# Altium footprint library ALL.PcbLib: 385 footprints (part 11 of 25) (continued)
## hdr-2x5-2.54mm-box [mil]
pads (10):
  oval 70x85 hole 48: 1(0,0) 2(0,100) 3(100,0) 4(100,100) 5(200,0) 6(200,100) 7(300,0) 8(300,100) 9(400,0) 10(400,100)
Top Overlay:
  lines w8: -200,0 -175,0 ; -200,100 -175,100 ; -191.67,0 -191.67,100 ; -25,-100 0,-50 25,-100 ; 125,-125 125,-100 ; 275,-125 275,-100 ; 575,0 600,0 ; 575,100 600,100 ; 591.67,0 591.67,100 ; 125,-100 275,-100 ; 125,-100 -175,-100 -175,200 575,200 575,-100 275,-100 ; -200,-125 -200,225 600,225 600,-125 -200,-125
  text "1" at -83,-25 h45
  text "2" at -89,83 h45
Mechanical 13:
  lines w3.94: 125,-125 125,-100 ; 275,-125 275,-100 ; 125,-100 -175,-100 -175,200 575,200 575,-100 275,-100 ; 125,-100 275,-100 ; 287.5,-12.5 287.5,0 ; 287.5,-12.5 300,-12.5 ; 287.5,-12.5 287.5,0 ; 287.5,-12.5 300,-12.5 ; 287.5,0 287.5,12.5 ; 287.5,0 287.5,12.5 ; 287.5,12.5 300,12.5 ; 287.5,12.5 300,12.5 ; 300,-12.5 312.5,-12.5 ; 300,-12.5 312.5,-12.5 ; 300,12.5 312.5,12.5 ; 300,12.5 312.5,12.5 ; 312.5,-12.5 312.5,0 ; 312.5,-12.5 312.5,0 ; 312.5,0 312.5,12.5 ; 312.5,0 312.5,12.5 ; -200,-125 600,-125 600,225 -200,225 -200,-125 ; -12.5,-12.5 0,-12.5 12.5,-12.5 12.5,0 12.5,12.5 0,12.5 -12.5,12.5 -12.5,0 -12.5,-12.5 ; -12.5,87.5 -12.5,100 -12.5,112.5 0,112.5 12.5,112.5 12.5,100 12.5,87.5 0,87.5 -12.5,87.5 ; 87.5,-12.5 87.5,0 87.5,12.5 100,12.5 112.5,12.5 112.5,0 112.5,-12.5 100,-12.5 87.5,-12.5 ; 87.5,87.5 87.5,100 87.5,112.5 100,112.5 112.5,112.5 112.5,100 112.5,87.5 100,87.5 87.5,87.5 ; 187.5,-12.5 187.5,0 187.5,12.5 200,12.5 212.5,12.5 212.5,0 212.5,-12.5 200,-12.5 187.5,-12.5 ; 187.5,87.5 187.5,100 187.5,112.5 200,112.5 212.5,112.5 212.5,100 212.5,87.5 200,87.5 187.5,87.5 ; 287.5,87.5 287.5,100 287.5,112.5 300,112.5 312.5,112.5 312.5,100 312.5,87.5 300,87.5 287.5,87.5 ; 387.5,-12.5 387.5,0 387.5,12.5 400,12.5 412.5,12.5 412.5,0 412.5,-12.5 400,-12.5 387.5,-12.5 ; 387.5,87.5 387.5,100 387.5,112.5 400,112.5 412.5,112.5 412.5,100 412.5,87.5 400,87.5 387.5,87.5
Mechanical 15:
  lines w3.94: 175,50 200,50 ; 200,25 200,50 ; 200,75 200,50 ; 225,50 200,50 ; -210,-135 -210,235 610,235 610,-135 -210,-135
3D body: height 346.46, standoff 0, extent -199.98,-124.98 599.98,224.98
3D body: height 78.74, standoff 0, extent -174.98,-99.98 574.98,199.98
3D body: height 118.11, standoff 0, extent 125.02,-124.98 274.98,-100.02
3D body: height 314.96, standoff -129.92, extent -12.48,-12.48 12.48,12.48
3D body: height 314.96, standoff -129.92, extent 87.52,-12.48 112.48,12.48
3D body: height 314.96, standoff -129.92, extent 187.52,-12.48 212.48,12.48
3D body: height 314.96, standoff -129.92, extent 287.52,-12.48 312.48,12.48
3D body: height 314.96, standoff -129.92, extent 387.52,-12.48 412.48,12.48
3D body: height 314.96, standoff -129.92, extent 387.52,87.52 412.48,112.48
3D body: height 314.96, standoff -129.92, extent 287.52,87.52 312.48,112.48
3D body: height 314.96, standoff -129.92, extent 187.52,87.52 212.48,112.48
3D body: height 314.96, standoff -129.92, extent 87.52,87.52 112.48,112.48
3D body: height 314.96, standoff -129.92, extent -12.48,87.52 12.48,112.48

## hdr-2x6-2.54-f [mm]
pads (12):
  round 1.8 hole 1: 1(0,0) 2(0,-2.54) 3(2.54,0) 4(2.54,-2.54) 5(5.08,0) 6(5.08,-2.54) 7(7.62,0) 8(7.62,-2.54) 9(10.16,0) 10(10.16,-2.54) 11(12.7,0) 12(12.7,-2.54)
Top Overlay:
  circle w0.2: c-1.73,0.03 r0.2
  lines w0.2: -1.27,-3.81 13.97,-3.81 13.97,1.27 -1.27,1.27 -1.27,-3.81
3D body "PBD-2.stp": height 8.5, standoff -3.15, extent 1.27,-3.81 3.81,1.27
3D body "PBD-2.stp": height 8.5, standoff -3.15, extent -1.27,-3.81 1.27,1.27
3D body "PBD-2.stp": height 8.5, standoff -3.15, extent 6.35,-3.81 8.89,1.27
3D body "PBD-2.stp": height 8.5, standoff -3.15, extent 3.81,-3.81 6.35,1.27
3D body "PBD-2.stp": height 8.5, standoff -3.15, extent 11.43,-3.81 13.97,1.27
3D body "PBD-2.stp": height 8.5, standoff -3.15, extent 8.89,-3.81 11.43,1.27

## hdr-2x6-2.54-r [mm]
pads (12):
  round 1.62 hole 1.02: 1(0,0) 2(0,2.54) 3(2.54,0) 4(2.54,2.54) 5(5.08,0) 6(5.08,2.54) 7(7.62,0) 8(7.62,2.54) 9(10.16,0) 10(10.16,2.54) 11(12.7,0) 12(12.7,2.54)
Top Overlay:
  lines w0.2: -1.72,-10.61 14.42,-10.61 14.42,3.801 -1.72,3.801 -1.72,-10.61
  text "12" at 14.761,1.905 h1.97
  text "11" at 14.761,-0.635 h1.97
  text "2" at -3.09,1.905 h1.97
  text "1" at -3.09,-0.635 h1.97
Top Solder:
  circle w0: c12.7,2.54 r0.861
  circle w0: c12.7,0 r0.861
  circle w0: c10.16,2.54 r0.861
  circle w0: c10.16,0 r0.861
  circle w0: c7.62,2.54 r0.861
  circle w0: c7.62,0 r0.861
  circle w0: c5.08,2.54 r0.861
  circle w0: c5.08,0 r0.861
  circle w0: c2.54,2.54 r0.861
  circle w0: c2.54,0 r0.861
  circle w0: c0,2.54 r0.861
  circle w0: c0,0 r0.861
Bottom Solder:
  circle w0: c12.7,2.54 r0.861
  circle w0: c12.7,0 r0.861
  circle w0: c10.16,2.54 r0.861
  circle w0: c10.16,0 r0.861
  circle w0: c7.62,2.54 r0.861
  circle w0: c7.62,0 r0.861
  circle w0: c5.08,2.54 r0.861
  circle w0: c5.08,0 r0.861
  circle w0: c2.54,2.54 r0.861
  circle w0: c2.54,0 r0.861
  circle w0: c0,2.54 r0.861
  circle w0: c0,0 r0.861
Mechanical 16:
  lines w0.1: -0.318,-4.318 -0.318,-9.855 -0.141,-10.16 0.141,-10.16 0.318,-9.855 0.318,-4.318 ; -0.318,-2.286 -0.318,2.596 0.318,2.596 0.318,-2.286 ; 2.222,-4.318 2.222,-9.855 2.399,-10.16 2.681,-10.16 2.858,-9.855 2.858,-4.318 ; 2.222,-2.286 2.222,2.596 2.858,2.596 2.858,-2.286 ; 4.762,-4.318 4.762,-9.855 4.939,-10.16 5.221,-10.16 5.398,-9.855 5.398,-4.318 ; 4.762,-2.286 4.762,2.596 5.398,2.596 5.398,-2.286 ; 7.302,-4.318 7.302,-9.855 7.479,-10.16 7.761,-10.16 7.938,-9.855 7.938,-4.318 ; 7.302,-2.286 7.302,2.596 7.938,2.596 7.938,-2.286 ; 9.842,-4.318 9.842,-9.855 10.019,-10.16 10.301,-10.16 10.478,-9.855 10.478,-4.318 ; 9.842,-2.286 9.842,2.596 10.478,2.596 10.478,-2.286 ; 12.382,-2.286 12.382,2.596 13.018,2.596 13.018,-2.286 ; 12.382,-4.318 13.018,-4.318 ; 12.382,-4.318 11.684,-4.318 11.43,-4.064 11.176,-4.318 9.144,-4.318 8.89,-4.064 8.636,-4.318 6.604,-4.318 6.35,-4.064 6.096,-4.318 4.064,-4.318 3.81,-4.064 3.556,-4.318 1.524,-4.318 1.27,-4.064 1.016,-4.318 -1.27,-4.318 -1.27,-2.286 -1.016,-2.286 -1.016,-1.778 -0.587,-1.778 -0.587,-2.286 0.587,-2.286 0.587,-1.778 1.016,-1.778 1.016,-2.286 1.27,-2.54 1.524,-2.286 1.524,-1.778 1.953,-1.778 1.953,-2.286 3.127,-2.286 3.127,-1.778 3.556,-1.778 3.556,-2.286 3.81,-2.54 4.064,-2.286 4.064,-1.778 4.493,-1.778 4.493,-2.286 5.667,-2.286 5.667,-1.778 6.096,-1.778 6.096,-2.286 6.35,-2.54 6.604,-2.286 6.604,-1.778 7.033,-1.778 7.033,-2.286 8.207,-2.286 8.207,-1.778 8.636,-1.778 8.636,-2.286 8.89,-2.54 9.144,-2.286 9.144,-1.778 9.573,-1.778 9.573,-2.286 10.747,-2.286 10.747,-1.778 11.176,-1.778 11.176,-2.286 11.43,-2.54 11.684,-2.286 11.684,-1.778 12.113,-1.778 12.113,-2.286 13.287,-2.286 13.287,-1.778 13.716,-1.778 13.716,-2.286 13.97,-2.286 13.97,-4.318 13.018,-4.318 ; 12.382,-4.318 12.382,-9.855 12.559,-10.16 12.841,-10.16 13.018,-9.855 13.018,-4.318
  text "12" at 14.761,1.905 h1.97
  text "11" at 14.761,-0.635 h1.97
  text "2" at -3.09,1.905 h1.97
  text "1" at -3.09,-0.635 h1.97
Mechanical 40:
  lines w0: -8.194,-4.318 -1.971,-4.318 ; -8.194,-1.778 -1.971,-1.778 ; -7.493,-3.366 -7.493,-4.318 ; -7.493,-2.73 -7.493,-1.778 ; -6.353,0 -0.701,0 ; -6.353,2.54 -0.701,2.54 ; -5.652,0.952 -5.652,0 ; -5.652,1.588 -5.652,2.54 ; -1.27,-9.083 -1.27,-5.019 ; -1.118,4.89 0,4.89 ; 0,5.591 0,3.241 0,6.607 ; 2.54,3.241 2.54,5.591 ; 5.359,-8.382 -1.27,-8.382 ; 5.359,5.906 0,5.906 ; 7.341,-8.382 13.97,-8.382 ; 7.341,5.906 12.7,5.906 ; 12.7,3.241 12.7,6.607 ; 13.97,-9.083 13.97,-5.019 ; -7.652,-3.683 -7.572,-3.746 -7.493,-4.318 ; -7.652,-3.683 -7.493,-3.81 ; -7.652,-3.683 -7.493,-4.318 ; -7.493,-4.318 -7.493,-3.81 ; -7.493,-4.318 -7.414,-3.746 -7.493,-3.81 ; -7.493,-4.318 -7.334,-3.683 -7.493,-3.81 ; -7.493,-2.286 -7.493,-1.778 ; -7.493,-2.286 -7.572,-2.35 -7.493,-1.778 ; -7.493,-2.286 -7.334,-2.413 ; -7.493,-2.286 -7.652,-2.413 -7.493,-1.778 ; -7.493,-1.778 -7.414,-2.35 -7.334,-2.413 ; -7.493,-1.778 -7.334,-2.413 ; -5.81,0.635 -5.731,0.572 -5.652,0 ; -5.81,0.635 -5.652,0.508 ; -5.81,0.635 -5.652,0 ; -5.652,0 -5.652,0.508 ; -5.652,0 -5.572,0.572 -5.652,0.508 ; -5.652,0 -5.493,0.635 -5.652,0.508 ; -5.652,2.032 -5.652,2.54 ; -5.652,2.032 -5.731,1.968 -5.652,2.54 ; -5.652,2.032 -5.493,1.905 ; -5.652,2.032 -5.81,1.905 -5.652,2.54 ; -5.652,2.54 -5.572,1.968 -5.493,1.905 ; -5.652,2.54 -5.493,1.905 ; -1.27,-8.382 -0.698,-8.303 -0.635,-8.223 ; -1.27,-8.382 -0.762,-8.382 ; -1.27,-8.382 -0.698,-8.461 -0.762,-8.382 ; -1.27,-8.382 -0.635,-8.541 -0.762,-8.382 ; -1.27,-8.382 -0.635,-8.223 ; -0.762,-8.382 -0.635,-8.223 ; 0,4.89 2.54,4.89 ; 0,4.89 0.572,4.969 0.635,5.048 ; 0,4.89 0.508,4.89 ; 0,4.89 0.572,4.81 0.508,4.89 ; 0,4.89 0.635,4.731 0.508,4.89 ; 0,4.89 0.635,5.048 ; 0,5.906 0.572,5.985 0.635,6.064 ; 0,5.906 0.508,5.906 ; 0,5.906 0.572,5.826 0.508,5.906 ; 0,5.906 0.635,5.747 0.508,5.906 ; 0,5.906 0.635,6.064 ; 0.508,4.89 0.635,5.048 ; 0.508,5.906 0.635,6.064 ; 1.905,4.731 1.968,4.81 2.54,4.89 ; 1.905,4.731 2.032,4.89 ; 1.905,4.731 2.54,4.89 ; 2.032,4.89 2.54,4.89 ; 2.032,4.89 1.968,4.969 2.54,4.89 ; 2.032,4.89 1.905,5.048 2.54,4.89 ; 12.065,5.747 12.128,5.826 12.7,5.906 ; 12.065,5.747 12.192,5.906 ; 12.065,5.747 12.7,5.906 ; 12.192,5.906 12.7,5.906 ; 12.192,5.906 12.128,5.985 12.7,5.906 ; 12.192,5.906 12.065,6.064 12.7,5.906 ; 13.335,-8.541 13.398,-8.461 13.97,-8.382 ; 13.335,-8.541 13.462,-8.382 ; 13.335,-8.541 13.97,-8.382 ; 13.462,-8.382 13.97,-8.382 ; 13.462,-8.382 13.398,-8.303 13.97,-8.382 ; 13.462,-8.382 13.335,-8.223 13.97,-8.382
  text "12.700" at 5.55,5.778 h0.39
  text "15.240" at 5.55,-8.509 h0.39
  text "2.540" at -2.629,4.762 h0.39
  text "2.540" at -6.312,1.143 h0.39
  text "2.540" at -8.153,-3.175 h0.39
3D body "TSW-106-25-T-D-RA.stp": height 4.54, standoff -3.56, extent -1.219,-12.198 14.021,2.851

## hdr-2x7-2.54-f [mm]
pads (14):
  round 1.8 hole 1: 1(0,0) 2(0,-2.54) 3(2.54,0) 4(2.54,-2.54) 5(5.08,0) 6(5.08,-2.54) 7(7.62,0) 8(7.62,-2.54) 9(10.16,0) 10(10.16,-2.54) 11(12.7,0) 12(12.7,-2.54) 13(15.24,0) 14(15.24,-2.54)
Top Overlay:
  circle w0.2: c-1.73,0.03 r0.2
  lines w0.2: -1.27,-3.81 -1.27,1.27 16.51,1.27 16.51,-3.81 -1.27,-3.81
3D body "PBD-2.stp": height 8.5, standoff -3.15, extent 13.97,-3.81 16.51,1.27
3D body "PBD-2.stp": height 8.5, standoff -3.15, extent 11.43,-3.81 13.97,1.27
3D body "PBD-2.stp": height 8.5, standoff -3.15, extent 8.89,-3.81 11.43,1.27
3D body "PBD-2.stp": height 8.5, standoff -3.15, extent 6.35,-3.81 8.89,1.27
3D body "PBD-2.stp": height 8.5, standoff -3.15, extent 3.81,-3.81 6.35,1.27
3D body "PBD-2.stp": height 8.5, standoff -3.15, extent 1.27,-3.81 3.81,1.27
3D body "PBD-2.stp": height 8.5, standoff -3.15, extent -1.27,-3.81 1.27,1.27

## hdr-2x7-2.54-r [mm]
pads (14):
  round 1.62 hole 1.02: 1(0,0) 2(0,2.54) 3(2.54,0) 4(2.54,2.54) 5(5.08,0) 6(5.08,2.54) 7(7.62,0) 8(7.62,2.54) 9(10.16,0) 10(10.16,2.54) 11(12.7,0) 12(12.7,2.54) 13(15.24,0) 14(15.24,2.54)
Top Overlay:
  lines w0.2: -1.72,-10.61 16.96,-10.61 16.96,3.801 -1.72,3.801 -1.72,-10.61
  text "14" at 17.301,1.905 h1.97
  text "13" at 17.301,-0.635 h1.97
  text "2" at -3.09,1.905 h1.97
  text "1" at -3.09,-0.635 h1.97
Top Solder:
  circle w0: c15.24,2.54 r0.861
  circle w0: c15.24,0 r0.861
  circle w0: c12.7,2.54 r0.861
  circle w0: c12.7,0 r0.861
  circle w0: c10.16,2.54 r0.861
  circle w0: c10.16,0 r0.861
  circle w0: c7.62,2.54 r0.861
  circle w0: c7.62,0 r0.861
  circle w0: c5.08,2.54 r0.861
  circle w0: c5.08,0 r0.861
  circle w0: c2.54,2.54 r0.861
  circle w0: c2.54,0 r0.861
  circle w0: c0,2.54 r0.861
  circle w0: c0,0 r0.861
Bottom Solder:
  circle w0: c15.24,2.54 r0.861
  circle w0: c15.24,0 r0.861
  circle w0: c12.7,2.54 r0.861
  circle w0: c12.7,0 r0.861
  circle w0: c10.16,2.54 r0.861
  circle w0: c10.16,0 r0.861
  circle w0: c7.62,2.54 r0.861
  circle w0: c7.62,0 r0.861
  circle w0: c5.08,2.54 r0.861
  circle w0: c5.08,0 r0.861
  circle w0: c2.54,2.54 r0.861
  circle w0: c2.54,0 r0.861
  circle w0: c0,2.54 r0.861
  circle w0: c0,0 r0.861
Mechanical 16:
  lines w0.1: -0.318,-4.318 -0.318,-9.855 -0.141,-10.16 0.141,-10.16 0.318,-9.855 0.318,-4.318 ; -0.318,-2.286 -0.318,2.596 0.318,2.596 0.318,-2.286 ; 2.222,-4.318 2.222,-9.855 2.399,-10.16 2.681,-10.16 2.858,-9.855 2.858,-4.318 ; 2.222,-2.286 2.222,2.596 2.858,2.596 2.858,-2.286 ; 4.762,-4.318 4.762,-9.855 4.939,-10.16 5.221,-10.16 5.398,-9.855 5.398,-4.318 ; 4.762,-2.286 4.762,2.596 5.398,2.596 5.398,-2.286 ; 7.302,-4.318 7.302,-9.855 7.479,-10.16 7.761,-10.16 7.938,-9.855 7.938,-4.318 ; 7.302,-2.286 7.302,2.596 7.938,2.596 7.938,-2.286 ; 9.842,-4.318 9.842,-9.855 10.019,-10.16 10.301,-10.16 10.478,-9.855 10.478,-4.318 ; 9.842,-2.286 9.842,2.596 10.478,2.596 10.478,-2.286 ; 12.382,-4.318 12.382,-9.855 12.559,-10.16 12.841,-10.16 13.018,-9.855 13.018,-4.318 ; 12.382,-2.286 12.382,2.596 13.018,2.596 13.018,-2.286 ; 14.922,-2.286 14.922,2.596 15.558,2.596 15.558,-2.286 ; 14.922,-4.318 15.558,-4.318 ; 14.922,-4.318 14.224,-4.318 13.97,-4.064 13.716,-4.318 11.684,-4.318 11.43,-4.064 11.176,-4.318 9.144,-4.318 8.89,-4.064 8.636,-4.318 6.604,-4.318 6.35,-4.064 6.096,-4.318 4.064,-4.318 3.81,-4.064 3.556,-4.318 1.524,-4.318 1.27,-4.064 1.016,-4.318 -1.27,-4.318 -1.27,-2.286 -1.016,-2.286 -1.016,-1.778 -0.587,-1.778 -0.587,-2.286 0.587,-2.286 0.587,-1.778 1.016,-1.778 1.016,-2.286 1.27,-2.54 1.524,-2.286 1.524,-1.778 1.953,-1.778 1.953,-2.286 3.127,-2.286 3.127,-1.778 3.556,-1.778 3.556,-2.286 3.81,-2.54 4.064,-2.286 4.064,-1.778 4.493,-1.778 4.493,-2.286 5.667,-2.286 5.667,-1.778 6.096,-1.778 6.096,-2.286 6.35,-2.54 6.604,-2.286 6.604,-1.778 7.033,-1.778 7.033,-2.286 8.207,-2.286 8.207,-1.778 8.636,-1.778 8.636,-2.286 8.89,-2.54 9.144,-2.286 9.144,-1.778 9.573,-1.778 9.573,-2.286 10.747,-2.286 10.747,-1.778 11.176,-1.778 11.176,-2.286 11.43,-2.54 11.684,-2.286 11.684,-1.778 12.113,-1.778 12.113,-2.286 13.287,-2.286 13.287,-1.778 13.716,-1.778 13.716,-2.286 13.97,-2.54 14.224,-2.286 14.224,-1.778 14.653,-1.778 14.653,-2.286 15.827,-2.286 15.827,-1.778 16.256,-1.778 16.256,-2.286 16.51,-2.286 16.51,-4.318 15.558,-4.318 ; 14.922,-4.318 14.922,-9.855 15.099,-10.16 15.381,-10.16 15.558,-9.855 15.558,-4.318
  text "14" at 17.301,1.905 h1.97
  text "13" at 17.301,-0.635 h1.97
  text "2" at -3.09,1.905 h1.97
  text "1" at -3.09,-0.635 h1.97
Mechanical 40:
  lines w0: -8.194,-4.318 -1.971,-4.318 ; -8.194,-1.778 -1.971,-1.778 ; -7.493,-3.366 -7.493,-4.318 ; -7.493,-2.73 -7.493,-1.778 ; -6.353,0 -0.701,0 ; -6.353,2.54 -0.701,2.54 ; -5.652,0.952 -5.652,0 ; -5.652,1.588 -5.652,2.54 ; -1.27,-9.083 -1.27,-5.019 ; -1.118,4.89 0,4.89 ; 0,5.591 0,3.241 0,6.607 ; 2.54,3.241 2.54,5.591 ; 6.629,-8.382 -1.27,-8.382 ; 6.629,5.906 0,5.906 ; 8.611,-8.382 16.51,-8.382 ; 8.611,5.906 15.24,5.906 ; 15.24,3.241 15.24,6.607 ; 16.51,-9.083 16.51,-5.019 ; -7.652,-3.683 -7.572,-3.746 -7.493,-4.318 ; -7.652,-3.683 -7.493,-3.81 ; -7.652,-3.683 -7.493,-4.318 ; -7.493,-4.318 -7.493,-3.81 ; -7.493,-4.318 -7.414,-3.746 -7.493,-3.81 ; -7.493,-4.318 -7.334,-3.683 -7.493,-3.81 ; -7.493,-2.286 -7.493,-1.778 ; -7.493,-2.286 -7.572,-2.35 -7.493,-1.778 ; -7.493,-2.286 -7.334,-2.413 ; -7.493,-2.286 -7.652,-2.413 -7.493,-1.778 ; -7.493,-1.778 -7.414,-2.35 -7.334,-2.413 ; -7.493,-1.778 -7.334,-2.413 ; -5.81,0.635 -5.731,0.572 -5.652,0 ; -5.81,0.635 -5.652,0.508 ; -5.81,0.635 -5.652,0 ; -5.652,0 -5.652,0.508 ; -5.652,0 -5.572,0.572 -5.652,0.508 ; -5.652,0 -5.493,0.635 -5.652,0.508 ; -5.652,2.032 -5.652,2.54 ; -5.652,2.032 -5.731,1.968 -5.652,2.54 ; -5.652,2.032 -5.493,1.905 ; -5.652,2.032 -5.81,1.905 -5.652,2.54 ; -5.652,2.54 -5.572,1.968 -5.493,1.905 ; -5.652,2.54 -5.493,1.905 ; -1.27,-8.382 -0.698,-8.303 -0.635,-8.223 ; -1.27,-8.382 -0.762,-8.382 ; -1.27,-8.382 -0.698,-8.461 -0.762,-8.382 ; -1.27,-8.382 -0.635,-8.541 -0.762,-8.382 ; -1.27,-8.382 -0.635,-8.223 ; -0.762,-8.382 -0.635,-8.223 ; 0,4.89 2.54,4.89 ; 0,4.89 0.572,4.969 0.635,5.048 ; 0,4.89 0.508,4.89 ; 0,4.89 0.572,4.81 0.508,4.89 ; 0,4.89 0.635,4.731 0.508,4.89 ; 0,4.89 0.635,5.048 ; 0,5.906 0.572,5.985 0.635,6.064 ; 0,5.906 0.508,5.906 ; 0,5.906 0.572,5.826 0.508,5.906 ; 0,5.906 0.635,5.747 0.508,5.906 ; 0,5.906 0.635,6.064 ; 0.508,4.89 0.635,5.048 ; 0.508,5.906 0.635,6.064 ; 1.905,4.731 1.968,4.81 2.54,4.89 ; 1.905,4.731 2.032,4.89 ; 1.905,4.731 2.54,4.89 ; 2.032,4.89 2.54,4.89 ; 2.032,4.89 1.968,4.969 2.54,4.89 ; 2.032,4.89 1.905,5.048 2.54,4.89 ; 14.605,5.747 14.668,5.826 15.24,5.906 ; 14.605,5.747 14.732,5.906 ; 14.605,5.747 15.24,5.906 ; 14.732,5.906 15.24,5.906 ; 14.732,5.906 14.668,5.985 15.24,5.906 ; 14.732,5.906 14.605,6.064 15.24,5.906 ; 15.875,-8.541 15.938,-8.461 16.51,-8.382 ; 15.875,-8.541 16.002,-8.382 ; 15.875,-8.541 16.51,-8.382 ; 16.002,-8.382 16.51,-8.382 ; 16.002,-8.382 15.938,-8.303 16.51,-8.382 ; 16.002,-8.382 15.875,-8.223 16.51,-8.382
  text "15.240" at 6.82,5.778 h0.39
  text "17.780" at 6.82,-8.509 h0.39
  text "2.540" at -2.629,4.762 h0.39
  text "2.540" at -6.312,1.143 h0.39
  text "2.540" at -8.153,-3.175 h0.39
3D body "TSW-107-08-S-D-RA.stp": height 5.54, standoff -2.31, extent -1.168,-9.957 16.612,2.807

## hdr-2x7-2.54mm-box [mm]
pads (14):
  rect 1.24x1.24 hole 0.89: 1(-9.373,8.23)
  round 1.24 hole 0.89: 2(-6.833,8.23) 3(-4.293,8.23) 4(-1.753,8.23) 5(0.787,8.23) 6(3.327,8.23) 7(5.867,8.23) 8(-9.373,5.69) 9(-6.833,5.69) 10(-4.293,5.69) 11(-1.753,5.69) 12(0.787,5.69) 13(3.327,5.69) 14(5.867,5.69)
Top Overlay:
  circle w0.2: c-12.563,8.23 r0.1
  lines w0.127: -14.402,2.515 -14.402,11.608 10.897,11.608 10.897,2.515 -14.402,2.515
Mechanical 13:
  circle w0.2: c-12.563,8.23 r0.1
  lines w0.127: -11.913,2.515 10.922,2.515 10.922,11.608 -14.427,11.608 -14.427,2.515 8.407,2.515
Mechanical 15:
  lines w0.05: -14.529,2.286 -14.529,11.76 11.125,11.76 11.125,2.286 -14.529,2.286
3D body "User Library-DC14P.STEP": height 8.93, standoff -3.17, extent -14.472,2.509 10.968,11.609

## hdr-2x8-2.54-f [mm]
pads (16):
  round 1.8 hole 1: 1(0,0) 2(0,-2.54) 3(2.54,0) 4(2.54,-2.54) 5(5.08,0) 6(5.08,-2.54) 7(7.62,0) 8(7.62,-2.54) 9(10.16,0) 10(10.16,-2.54) 11(12.7,0) 12(12.7,-2.54) 13(15.24,0) 14(15.24,-2.54) 15(17.78,0) 16(17.78,-2.54)
Top Overlay:
  circle w0.2: c-1.73,0.03 r0.2
  lines w0.2: -1.27,-3.81 -1.27,1.27 19.05,1.27 19.05,-3.81 -1.27,-3.81
3D body "PBD-2.stp": height 8.5, standoff -3.15, extent 13.97,-3.81 16.51,1.27
3D body "PBD-2.stp": height 8.5, standoff -3.15, extent 16.51,-3.81 19.05,1.27
3D body "PBD-2.stp": height 8.5, standoff -3.15, extent 8.89,-3.81 11.43,1.27
3D body "PBD-2.stp": height 8.5, standoff -3.15, extent 11.43,-3.81 13.97,1.27
3D body "PBD-2.stp": height 8.5, standoff -3.15, extent 3.81,-3.81 6.35,1.27
3D body "PBD-2.stp": height 8.5, standoff -3.15, extent 6.35,-3.81 8.89,1.27
3D body "PBD-2.stp": height 8.5, standoff -3.15, extent -1.27,-3.81 1.27,1.27
3D body "PBD-2.stp": height 8.5, standoff -3.15, extent 1.27,-3.81 3.81,1.27

## hdr-2x8-2.54-r [mm]
pads (16):
  round 1.62 hole 1.02: 1(-0.025,0) 2(-0.025,2.54) 3(2.515,0) 4(2.515,2.54) 5(5.055,0) 6(5.055,2.54) 7(7.595,0) 8(7.595,2.54) 9(10.135,0) 10(10.135,2.54) 11(12.675,0) 12(12.675,2.54) 13(15.215,0) 14(15.215,2.54) 15(17.755,0) 16(17.755,2.54)
Top Overlay:
  lines w0.2: -1.745,-10.61 -1.745,3.801 19.475,3.801 19.475,-10.61 -1.745,-10.61
  text "1" at -3.115,-0.635 h1.97
  text "2" at -3.115,1.905 h1.97
  text "15" at 19.816,-0.635 h1.97
  text "16" at 19.816,1.905 h1.97
Top Solder:
  circle w0: c-0.025,0 r0.861
  circle w0: c-0.025,2.54 r0.861
  circle w0: c2.515,0 r0.861
  circle w0: c2.515,2.54 r0.861
  circle w0: c5.055,0 r0.861
  circle w0: c5.055,2.54 r0.861
  circle w0: c7.595,0 r0.861
  circle w0: c7.595,2.54 r0.861
  circle w0: c10.135,0 r0.861
  circle w0: c10.135,2.54 r0.861
  circle w0: c12.675,0 r0.861
  circle w0: c12.675,2.54 r0.861
  circle w0: c15.215,0 r0.861
  circle w0: c15.215,2.54 r0.861
  circle w0: c17.755,0 r0.861
  circle w0: c17.755,2.54 r0.861
Bottom Solder:
  circle w0: c-0.025,0 r0.861
  circle w0: c-0.025,2.54 r0.861
  circle w0: c2.515,0 r0.861
  circle w0: c2.515,2.54 r0.861
  circle w0: c5.055,0 r0.861
  circle w0: c5.055,2.54 r0.861
  circle w0: c7.595,0 r0.861
  circle w0: c7.595,2.54 r0.861
  circle w0: c10.135,0 r0.861
  circle w0: c10.135,2.54 r0.861
  circle w0: c12.675,0 r0.861
  circle w0: c12.675,2.54 r0.861
  circle w0: c15.215,0 r0.861
  circle w0: c15.215,2.54 r0.861
  circle w0: c17.755,0 r0.861
  circle w0: c17.755,2.54 r0.861
Mechanical 16:
  drawing of 162 lines, arcs and shapes, not listed
  text "1" at -3.115,-0.635 h1.97
  text "2" at -3.115,1.905 h1.97
  text "15" at 19.816,-0.635 h1.97
  text "16" at 19.816,1.905 h1.97
Mechanical 40:
  lines w0: -8.219,-4.318 -1.996,-4.318 ; -8.219,-1.778 -1.996,-1.778 ; -7.518,-3.366 -7.518,-4.318 ; -7.518,-2.73 -7.518,-1.778 ; -6.378,0 -0.726,0 ; -6.378,2.54 -0.726,2.54 ; -5.677,0.952 -5.677,0 ; -5.677,1.588 -5.677,2.54 ; -1.295,-9.083 -1.295,-5.019 ; -1.144,4.89 -0.025,4.89 ; -0.025,5.591 -0.025,3.241 -0.025,6.607 ; 2.515,3.241 2.515,5.591 ; 7.873,-8.382 -1.295,-8.382 ; 7.873,5.906 -0.025,5.906 ; 9.856,-8.382 19.025,-8.382 ; 9.856,5.906 17.755,5.906 ; 17.755,3.241 17.755,6.607 ; 19.025,-9.083 19.025,-5.019 ; -7.677,-3.683 -7.518,-4.318 ; -7.677,-3.683 -7.518,-3.81 ; -7.677,-3.683 -7.597,-3.746 -7.518,-4.318 ; -7.518,-4.318 -7.359,-3.683 -7.518,-3.81 ; -7.518,-4.318 -7.439,-3.746 -7.518,-3.81 ; -7.518,-4.318 -7.518,-3.81 ; -7.518,-2.286 -7.677,-2.413 -7.518,-1.778 ; -7.518,-2.286 -7.359,-2.413 ; -7.518,-2.286 -7.597,-2.35 -7.518,-1.778 ; -7.518,-2.286 -7.518,-1.778 ; -7.518,-1.778 -7.359,-2.413 ; -7.518,-1.778 -7.439,-2.35 -7.359,-2.413 ; -5.835,0.635 -5.677,0 ; -5.835,0.635 -5.677,0.508 ; -5.835,0.635 -5.756,0.572 -5.677,0 ; -5.677,0 -5.518,0.635 -5.677,0.508 ; -5.677,0 -5.597,0.572 -5.677,0.508 ; -5.677,0 -5.677,0.508 ; -5.677,2.032 -5.835,1.905 -5.677,2.54 ; -5.677,2.032 -5.518,1.905 ; -5.677,2.032 -5.756,1.968 -5.677,2.54 ; -5.677,2.032 -5.677,2.54 ; -5.677,2.54 -5.518,1.905 ; -5.677,2.54 -5.597,1.968 -5.518,1.905 ; -1.295,-8.382 -0.66,-8.223 ; -1.295,-8.382 -0.66,-8.541 -0.787,-8.382 ; -1.295,-8.382 -0.723,-8.461 -0.787,-8.382 ; -1.295,-8.382 -0.787,-8.382 ; -1.295,-8.382 -0.723,-8.303 -0.66,-8.223 ; -0.787,-8.382 -0.66,-8.223 ; -0.025,4.89 0.61,5.048 ; -0.025,4.89 0.61,4.731 0.483,4.89 ; -0.025,4.89 0.547,4.81 0.483,4.89 ; -0.025,4.89 0.483,4.89 ; -0.025,4.89 0.547,4.969 0.61,5.048 ; -0.025,4.89 2.515,4.89 ; -0.025,5.906 0.61,6.064 ; -0.025,5.906 0.61,5.747 0.483,5.906 ; -0.025,5.906 0.547,5.826 0.483,5.906 ; -0.025,5.906 0.483,5.906 ; -0.025,5.906 0.547,5.985 0.61,6.064 ; 0.483,4.89 0.61,5.048 ; 0.483,5.906 0.61,6.064 ; 1.88,4.731 2.515,4.89 ; 1.88,4.731 2.007,4.89 ; 1.88,4.731 1.943,4.81 2.515,4.89 ; 2.007,4.89 1.88,5.048 2.515,4.89 ; 2.007,4.89 1.943,4.969 2.515,4.89 ; 2.007,4.89 2.515,4.89 ; 17.12,5.747 17.755,5.906 ; 17.12,5.747 17.247,5.906 ; 17.12,5.747 17.183,5.826 17.755,5.906 ; 17.247,5.906 17.12,6.064 17.755,5.906 ; 17.247,5.906 17.183,5.985 17.755,5.906 ; 17.247,5.906 17.755,5.906 ; 18.39,-8.541 19.025,-8.382 ; 18.39,-8.541 18.517,-8.382 ; 18.39,-8.541 18.453,-8.461 19.025,-8.382 ; 18.517,-8.382 18.39,-8.223 19.025,-8.382 ; 18.517,-8.382 18.453,-8.303 19.025,-8.382 ; 18.517,-8.382 19.025,-8.382
  text "2.540" at -8.178,-3.175 h0.39
  text "2.540" at -6.337,1.143 h0.39
  text "2.540" at -2.654,4.762 h0.39
  text "20.320" at 8.064,-8.509 h0.39
  text "17.780" at 8.064,5.778 h0.39
3D body "TSW-108-25-T-D-RA.stp": height 5.54, standoff -2.56, extent -1.295,-12.243 19.025,2.807

## hdr-2x9-2.54-f [mm]
pads (18):
  round 1.8 hole 1: 1(0,0) 2(0,-2.54) 3(2.54,0) 4(2.54,-2.54) 5(5.08,0) 6(5.08,-2.54) 7(7.62,0) 8(7.62,-2.54) 9(10.16,0) 10(10.16,-2.54) 11(12.7,0) 12(12.7,-2.54) 13(15.24,0) 14(15.24,-2.54) 15(17.78,0) 16(17.78,-2.54) 17(20.32,0) 18(20.32,-2.54)
Top Overlay:
  circle w0.2: c-1.73,0.03 r0.2
  lines w0.2: -1.27,-3.81 21.59,-3.81 21.59,1.27 -1.27,1.27 -1.27,-3.81
3D body "PBD-2.stp": height 8.5, standoff -3.15, extent 13.97,-3.81 16.51,1.27
3D body "PBD-2.stp": height 8.5, standoff -3.15, extent 16.51,-3.81 19.05,1.27
3D body "PBD-2.stp": height 8.5, standoff -3.15, extent 8.89,-3.81 11.43,1.27
3D body "PBD-2.stp": height 8.5, standoff -3.15, extent 11.43,-3.81 13.97,1.27
3D body "PBD-2.stp": height 8.5, standoff -3.15, extent 3.81,-3.81 6.35,1.27
3D body "PBD-2.stp": height 8.5, standoff -3.15, extent 6.35,-3.81 8.89,1.27
3D body "PBD-2.stp": height 8.5, standoff -3.15, extent -1.27,-3.81 1.27,1.27
3D body "PBD-2.stp": height 8.5, standoff -3.15, extent 1.27,-3.81 3.81,1.27
3D body "PBD-2.stp": height 8.5, standoff -3.15, extent 19.05,-3.81 21.59,1.27